# Altium footprint library Control_Board_Model.PcbLib: 160 footprints (part 2 of 10)
Each footprint in its own frame and in the unit in brackets; x right, y up, seen from the top. Pads: shape width x height; smd on the part's side, far side on the other; paste and mask are expansions set on the pad; w line width, h text height; cw(c..) or ccw(c..) is an arc to the next point about the centre after c.
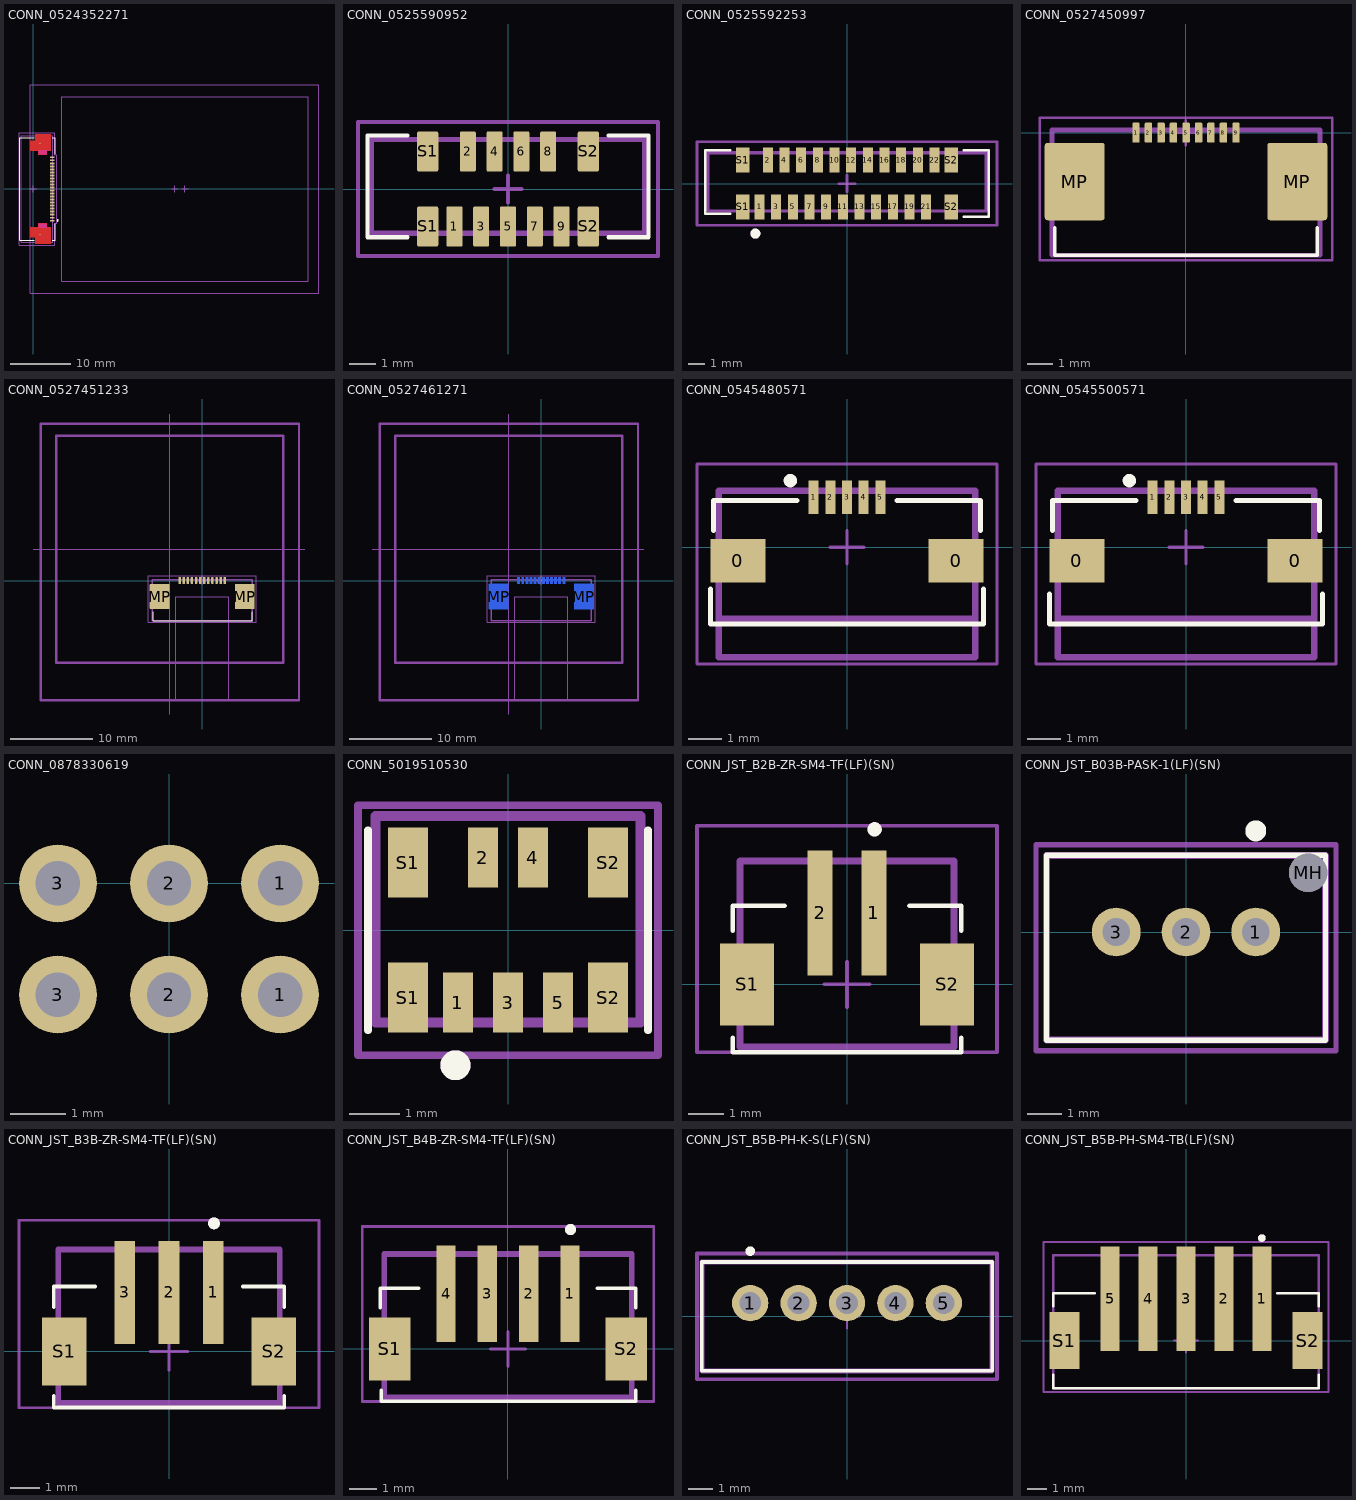
[diagram p1: the footprints below, top view; thin cyan lines are the x and y axes]

## CONN_0524352271 [mm] "TFT LCD MODULE"
height 7
pads (24):
  rect 0.8x0.3 smd mask+0.05: 1(3.1,-5.25) 2(3.1,-4.75) 3(3.1,-4.25) 4(3.1,-3.75) 5(3.1,-3.25) 6(3.1,-2.75) 7(3.1,-2.25) 8(3.1,-1.75) 9(3.1,-1.25) 10(3.1,-0.75) 11(3.1,-0.25) 12(3.1,0.25) 13(3.1,0.75) 14(3.1,1.25) 15(3.1,1.75) 16(3.1,2.25) 17(3.1,2.75) 18(3.1,3.25) 19(3.1,3.75) 20(3.1,4.25) 21(3.1,4.75) 22(3.1,5.25)
  rect 0.2x0.2 smd mask+0.05: 23(1.1,7.55) 24(1.1,-7.55)
Top Layer:
  pour cut-out: -0.55,-6.3 -0.55,-8 0.3,-8 0.3,-9.1 2.9,-9.1 2.9,-6.3 2.2,-6.3 2.2,-5.7 0.8,-5.7 0.8,-6.3
  pour cut-out: -0.55,6.3 -0.55,8 0.3,8 0.3,9.1 2.9,9.1 2.9,6.3 2.2,6.3 2.2,5.7 0.8,5.7 0.8,6.3
  region: 2.7,-6.5 2.7,-8.9 0.5,-8.9 0.5,-7.8 -0.35,-7.8 -0.35,-6.5
  region: 2.7,6.5 2.7,8.9 0.5,8.9 0.5,7.8 -0.35,7.8 -0.35,6.5
Top Layer keep-out:
  rectangle: 0.8,-6.5 2.2,-5.7
  rectangle: 0.8,5.7 2.2,6.5
Top Overlay:
  circle w0.2: c4.005,-5.207 r0.1
  lines w0.152: 0.1,-8.5 -2.3,-8.5 -2.3,8.5 0.1,8.5 ; 3.1,-8.5 3.6,-8.5 3.6,-5.761 ; 3.1,8.5 3.6,8.5 3.6,5.761
Top Paste:
  region: 2.7,6.5 2.7,8.9 0.5,8.9 0.5,7.8 -0.35,7.8 -0.35,6.5
  region: 2.7,-6.5 2.7,-8.9 0.5,-8.9 0.5,-7.8 -0.35,-7.8 -0.35,-6.5
Top Solder:
  region: 2.75,-6.45 2.75,-8.95 0.45,-8.95 0.45,-7.85 -0.4,-7.85 -0.4,-6.45
  region: 2.75,6.45 2.75,8.95 0.45,8.95 0.45,7.85 -0.4,7.85 -0.4,6.45
Mechanical 14:
  lines w0.2: -2,-8.8 3.2,-8.8 3.2,8.8 -2,8.8 -2,-8.8
  text "22" at 1.465,5.969 h1
  text "1" at 1.465,-5.08 h1
  text "'.Designator'" at -0.9,-0.2 h0.5
Mechanical 15:
  lines w0.1: -0.5,0 0.5,0 ; 0,-0.5 0,0.5
  lines w0.152: -2.4,-9.3 0.1,-9.3 3.1,-9.3 3.554,-9.3 3.554,-5.682 3.875,-5.682 3.875,5.682 3.554,5.682 3.554,9.3 -2.4,9.3 -2.4,-9.3
Mechanical 19:
  lines w0.2: 22.9,0 23.9,0 ; 23.4,-0.5 23.4,0.5 ; 24.6,0 25.6,0 ; 25.1,-0.5 25.1,0.5 ; -0.5,-17.3 -0.5,17.3 47.3,17.3 47.3,-17.3 -0.5,-17.3 ; 4.7,-15.3 4.7,15.3 45.5,15.3 45.5,-15.3 4.7,-15.3
  text "Top Left Corner" at 43.9,-14.8 h1
  text "Center of the screen" at 25.7,-8.9 h1
  text "Center of the panel" at 21.7,-9.1 h1
3D body "524352271.stp": height 2.1, standoff 0.05, extent -2,-8.8 3.2,8.8
3D body: height -6, standoff -8, extent -0.5,-17.3 47.3,17.3

## CONN_0525590952 [mm] "9 Position FFC, FPC Connector Contacts, Vertical - 1 Sided 0.020\" (0.50mm) Surface Mount"
height 3.9
pads (13):
  rrect20% 0.6x1.5 smd mask+0.05: 1(-2,-1.4) 2(-1.5,1.4) 3(-1,-1.4) 4(-0.5,1.4) 5(0,-1.4) 6(0.5,1.4) 7(1,-1.4) 8(1.5,1.4) 9(2,-1.4)
  rrect20% 0.8x1.5 smd mask+0.05: S1(-3,-1.4) S1(-3,1.4) S2(3,-1.4) S2(3,1.4)
Top Overlay:
  lines w0.152: -3.75,-1.8 -5.25,-1.8 -5.25,2 -3.75,2 ; 3.75,-1.8 5.25,-1.8 5.25,2 3.75,2
Mechanical 14:
  lines w0.2: -5.1,-1.65 -5.1,1.85 5.1,1.85 5.1,-1.65 -5.1,-1.65
Mechanical 15:
  lines w0.152: -0.5,0 0.5,0 ; 0,-0.5 0,0.5 ; -5.6,-2.5 -5.6,2.5 5.6,2.5 5.6,-2.5 -5.6,-2.5
3D body "525590952.stp": height 3.9, standoff 0, extent -5.1,-1.65 5.1,1.85

## CONN_0525592253 [mm] "22 Position FFC, FPC Connector Contacts, Vertical - 1 Sided 0.020\" (0.50mm) Surface Mount"
height 3.9
pads (26):
  rect 0.6x1.5 smd mask+0.05: 1(-5.25,-1.4) 2(-4.75,1.4) 3(-4.25,-1.4) 4(-3.75,1.4) 5(-3.25,-1.4) 6(-2.75,1.4) 7(-2.25,-1.4) 8(-1.75,1.4) 9(-1.25,-1.4) 10(-0.75,1.4) 11(-0.25,-1.4) 12(0.25,1.4) 13(0.75,-1.4) 14(1.25,1.4) 15(1.75,-1.4) 16(2.25,1.4) 17(2.75,-1.4) 18(3.25,1.4) 19(3.75,-1.4) 20(4.25,1.4) 21(4.75,-1.4) 22(5.25,1.4)
  rect 0.8x1.5 smd mask+0.05: S1(-6.25,-1.4) S1(-6.25,1.4) S2(6.25,-1.4) S2(6.25,1.4)
Top Overlay:
  circle w0.3: c-5.5,-3 r0.15
  lines w0.152: -7,-1.8 -8.5,-1.8 -8.5,2 -7,2 ; 7,-2 8.5,-2 8.5,2 7,2
Mechanical 14:
  circle w0.3: c-5.5,-3 r0.15
  lines w0.2: -8.35,-1.65 -8.35,1.85 8.35,1.85 8.35,-1.65 -8.35,-1.65
  text "'.Designator'" at -1.2,-0.2 h0.5
Mechanical 15:
  lines w0.152: -0.5,0 0.5,0 ; 0,-0.5 0,0.5 ; -9,-2.5 -9,2.5 9,2.5 9,-2.5 -9,-2.5
3D body "525592253.stp": height 3.9, standoff 0, extent -8.35,-1.65 8.35,1.85

## CONN_0527450997 [mm] "9 Position - Connector Contacts, Top 0.020\" (0.50mm) Surface Mount, Right Angle"
height 2
pads (11):
  rrect20% 0.3x0.8 smd: 1(-2,0) 2(-1.5,0) 3(-1,0) 4(-0.5,0) 5(0,0) 6(0.5,0) 7(1,0) 8(1.5,0) 9(2,0)
  rrect10% 2.4x3.1 smd: MP(-4.45,-1.95) MP(4.45,-1.95)
Top Overlay:
  lines w0.152: -5.25,-3.8 -5.25,-4.9 5.25,-4.9 5.25,-3.8
Mechanical 14:
  lines w0.2: -5.35,-4.9 5.35,-4.9 5.35,0.1 -5.35,0.1 -5.35,-4.9
  text "'.Designator'" at -2.75,-2.25 h0.5
  text "1" at -2.05,-1.2 h0.5
  text "9" at 1.825,-1.225 h0.5
Mechanical 15:
  lines w0.1: -0.5,0 0.5,0 ; 0,-0.5 0,0.5 ; -5.85,-5.1 -5.85,0.6 5.85,0.6 5.85,-5.1 -5.85,-5.1
3D body "527450997.stp": height 2, standoff 0, extent -5.3,-4.9 5.3,0.1

## CONN_0527451233 [mm] "12 Position FFC, FPC Connector Contacts, Top 0.020\" (0.50mm) Surface Mount, Right Angle"
height 2
pads (14):
  rrect20% 0.3x0.8 smd: 1(2.75,0) 2(2.25,0) 3(1.75,0) 4(1.25,0) 5(0.75,0) 6(0.25,0) 7(-0.25,0) 8(-0.75,0) 9(-1.25,0) 10(-1.75,0) 11(-2.25,0) 12(-2.75,0)
  rrect10% 2.4x3.1 smd: MP(-5.2,-1.95) MP(5.2,-1.95)
Top Overlay:
  lines w0.152: -6,-3.8 -6,-4.9 6.1,-4.9 6.1,-3.8
Mechanical 14:
  lines w0.1: -20.6,3.8 12.5,3.8 ; -3.95,-16.275 -3.95,20.3 ; -3.25,-14.6 -3.25,-2 3.25,-2 3.25,-14.6 -3.25,-14.6
  lines w0.2: -6.1,-4.9 6.1,-4.9 6.1,0.1 -6.1,0.1 -6.1,-4.9
  lines w0.3: -19.7,-14.6 -19.7,19.1 11.8,19.1 11.8,-14.6 -3.95,-14.6 -19.7,-14.6 ; -17.8,-10.05 -17.8,17.65 9.9,17.65 9.9,-10.05 -17.8,-10.05
  text "'.Designator'" at -2.8,-2 h0.5
  text "1" at 2.7,-1.2 h0.5
  text "12" at -3.1,-1.2 h0.5
Mechanical 15:
  lines w0.1: -0.5,0 0.5,0 ; 0,-0.5 0,0.5 ; -6.6,-5.1 -6.6,0.6 6.6,0.6 6.6,-5.1 -6.6,-5.1
3D body: height 3.5, standoff 2, extent -19.7,-14.6 11.8,19.1
3D body: height 3.6, standoff 2, extent -17.8,-10.05 9.9,17.65
3D body "527451233.stp": height 2, standoff 0, extent -6.05,-4.9 6.05,0.1

## CONN_0527461271 [mm] "12 Position FFC, FPC Connector Contacts, Bottom 0.020\" (0.50mm) Surface Mount, Right Angle"
height 1.5
pads (14):
  rrect20% 0.3x0.8 smd far side: 1(2.75,0) 2(2.25,0) 3(1.75,0) 4(1.25,0) 5(0.75,0) 6(0.25,0) 7(-0.25,0) 8(-0.75,0) 9(-1.25,0) 10(-1.75,0) 11(-2.25,0) 12(-2.75,0)
  rrect10% 2.4x3.1 smd far side: MP(-5.2,-1.95) MP(5.2,-1.95)
Bottom Overlay:
  lines w0.152: -6.1,-3.8 -6.1,-4.9 6,-4.9 6,-3.8
Mechanical 14:
  lines w0.1: -20.6,3.8 12.5,3.8 ; -3.95,-16.275 -3.95,20.3 ; -3.25,-14.6 -3.25,-2 3.25,-2 3.25,-14.6 -3.25,-14.6
  lines w0.2: -6.1,-4.9 -6.1,0.1 6.1,0.1 6.1,-4.9 -6.1,-4.9
  lines w0.3: -19.7,-14.6 -19.7,19.1 11.8,19.1 11.8,-14.6 -3.95,-14.6 -19.7,-14.6 ; -17.8,-10.05 -17.8,17.65 9.9,17.65 9.9,-10.05 -17.8,-10.05
  text "'.Designator'" at 2.8,-2 h0.5
  text "1" at 2.8,-1.2 h0.5
  text "12" at -2.4,-1.2 h0.5
Mechanical 15:
  lines w0.1: -0.5,0 0.5,0 ; 0,-0.5 0,0.5 ; -6.6,-5.1 6.6,-5.1 6.6,0.6 -6.6,0.6 -6.6,-5.1
3D body: height 3.5, standoff 2, extent -19.7,-14.6 11.8,19.1
3D body: height 3.6, standoff 2, extent -17.8,-10.05 9.9,17.65
3D body "527461271.stp": height 2, standoff -0.02, extent -6.05,-4.9 6.05,0.1

## CONN_0545480571 [mm] "5 Position FFC, FPC Connector Contacts, Bottom 0.020\" (0.50mm) Surface Mount, Right Angle"
height 1.2
pads (7):
  rect 1.65x1.3 smd mask+0.05: 0(-3.275,-0.4) 0(3.275,-0.4)
  rect 0.3x1 smd mask+0.05: 1(-1,1.5) 2(-0.5,1.5) 3(0,1.5) 4(0.5,1.5) 5(1,1.5)
Top Overlay:
  circle w0.2: c-1.7,2 r0.1
  lines w0.152: -4.1,-1.25 -4.1,-2.3 4.1,-2.3 4.1,-1.25 ; -4,0.5 -4,1.4 -1.5,1.4 ; 1.5,1.4 4,1.4 4,0.5
Mechanical 14:
  lines w0.2: -3.85,-2.15 3.85,-2.15 ; -3.85,-3.3 3.85,-3.3 3.85,1.7 -3.85,1.7 -3.85,-3.3
  text "'.Designator'" at -1,-1.5 h0.5
  text "1" at -1.1,0.3 h0.5
  text "5" at 0.9,0.3 h0.5
Mechanical 15:
  lines w0.1: -0.5,0 0.5,0 ; 0,-0.5 0,0.5 ; -4.5,-3.5 -4.5,2.5 4.5,2.5 4.5,-3.5 -4.5,-3.5
3D body "545480571.stp": height 1.18, standoff -0.02, extent -3.85,-3.3 3.85,1.7

## CONN_0545500571 [mm] "5 Position FFC, FPC Connector Contacts, Top 0.020\" (0.50mm) Surface Mount, Right Angle"
height 1.2
pads (7):
  rect 1.65x1.3 smd mask+0.05: 0(-3.275,-0.4) 0(3.275,-0.4)
  rect 0.3x1 smd mask+0.05: 1(-1,1.5) 2(-0.5,1.5) 3(0,1.5) 4(0.5,1.5) 5(1,1.5)
Top Overlay:
  circle w0.2: c-1.7,2 r0.1
  lines w0.152: -4.1,-1.4 -4.1,-2.3 4.1,-2.3 4.1,-1.4 ; -4,0.5 -4,1.4 -1.5,1.4 ; 1.5,1.4 4,1.4 4,0.5
Mechanical 14:
  lines w0.2: -3.85,-2.15 3.85,-2.15 ; -3.85,-3.3 -3.85,1.7 3.85,1.7 3.85,-3.3 -3.85,-3.3
  text "5" at 0.9,0.3 h0.5
  text "1" at -1.1,0.3 h0.5
  text "'.Designator'" at -1,-1.5 h0.5
Mechanical 15:
  lines w0.1: -0.5,0 0.5,0 ; 0,-0.5 0,0.5 ; -4.5,-3.5 4.5,-3.5 4.5,2.5 -4.5,2.5 -4.5,-3.5
3D body "545500571.stp": height 1.2, standoff 0, extent -3.85,-3.3 3.85,1.7

## CONN_0878330619 [mm] "Connector Header Through Hole, Right Angle 6 position 0.079\" (2.00mm)"
height 6.3
pads (6):
  round 1.4 hole 0.8: 1(2,-2) 1(2,0) 2(0,-2) 2(0,0) 3(-2,-2) 3(-2,0)
Mechanical 15:
  lines w0.1: -0.5,0 0.5,0 ; 0,-0.5 0,0.5
3D body "878330619.stp": height 6.35, standoff -2.11, extent -4.325,-8.4 4.325,0.25

## CONN_5019510530 [mm] "5 Position FFC, FPC Connector Contacts, Vertical - 1 Sided 0.020\" (0.50mm) Surface Mount"
height 4.04
pads (9):
  rect 0.6x1.2 smd mask+0.05: 1(-1,-1.45) 2(-0.5,1.45) 3(0,-1.45) 4(0.5,1.45) 5(1,-1.45)
  rect 0.8x1.4 smd mask+0.05: S1(-2,-1.35) S1(-2,1.35) S2(2,-1.35) S2(2,1.35)
Top Overlay:
  circle w0.3: c-1.05,-2.7 r0.15
  lines w0.152: -2.8,-2 -2.8,2 ; 2.8,-2 2.8,2
Mechanical 14:
  circle w0.3: c-1.05,-2.7 r0.15
  lines w0.2: -2.65,-1.85 -2.65,2.284 2.65,2.284 2.65,-1.85 -2.65,-1.85
  text "'.Designator'" at -1.3,-0.2 h0.5
Mechanical 15:
  lines w0.152: -3,-2.5 -3,2.5 3,2.5 3,-2.5 -3,-2.5
3D body "5019510530.stp": height 4.34, standoff 0, extent -2.65,-1.85 2.65,2.284

## CONN_JST_B2B-ZR-SM4-TF(LF)(SN) [mm] "Connector Header Surface Mount 2 position 0.059\" (1.50mm)"
height 5
pads (4):
  rect 0.7x3.5 smd: 1(0.75,2) 2(-0.75,2)
  rect 1.5x2.3 smd: S1(-2.8,0) S2(2.8,0)
Top Overlay:
  circle w0.2: c0.774,4.34 r0.1
  lines w0.127: -3.2,-1.5 -3.2,-1.9 3.2,-1.9 3.2,-1.5 ; -3.2,1.5 -3.2,2.2 -1.75,2.2 ; 1.75,2.2 3.2,2.2 3.2,1.5
Mechanical 14:
  circle w0.2: c0.774,4.34 r0.1
  lines w0.2: -3,-1.75 3,-1.75 3,3.45 -3,3.45 -3,-1.75
  text "'.Designator'" at -1.766,-0.254 h0.5
Mechanical 15:
  lines w0.1: -0.635,0 0.635,0 ; 0,-0.635 0,0.635 ; -4.2,-1.905 -4.2,4.445 4.2,4.445 4.2,-1.905 -4.2,-1.905
3D body "B2B-ZR-SM4-TF.STEP": height 5, standoff 0, extent -3,-1.75 3,3.45

## CONN_JST_B03B-PASK-1(LF)(SN) [mm] "Connector Header Through Hole 3 position 0.079\" (2.00mm)"
height 7.7
pads (4):
  round 1.4 hole 0.8: 1(2,0) 2(0,0) 3(-2,0)
  round 1.1 hole 1.1 unplated: MH(3.5,1.7)
Top Overlay:
  circle w0.4: c2,2.9 r0.1
  lines w0.152: -4,-3.1 -4,2.2 4,2.2 4,-3.1 -4,-3.1
Mechanical 14:
  lines w0.2: -4,-3.1 -4,2.2 4,2.2 4,-3.1 -4,-3.1
  text "1" at 1.9,-0.4 h1.02
  text "2" at -0.3,-0.4 h1.02
  text "3" at -2.2,-0.5 h1.02
  text "'.Designator'" at -2.5,-1 h0.5
Mechanical 15:
  lines w0.1: -0.5,0 0.5,0 ; 0,-0.5 0,0.5
  lines w0.152: -4.3,-3.4 4.3,-3.4 4.3,2.5 -4.3,2.5 -4.3,-3.4
3D body "B03B-PASK-1 (2).STEP": height 7.7, standoff -2.7, extent -4,-3.1 4,2.2

## CONN_JST_B3B-ZR-SM4-TF(LF)(SN) [mm] "Connector Header Surface Mount 3 position 0.059\" (1.50mm)"
height 5
pads (5):
  rect 0.7x3.5 smd: 1(1.5,2) 2(0,2) 3(-1.5,2)
  rect 1.5x2.3 smd: S1(-3.55,0) S2(3.55,0)
Top Overlay:
  circle w0.2: c1.524,4.34 r0.1
  lines w0.127: -3.9,-1.5 -3.9,-1.9 3.9,-1.9 3.9,-1.5 ; -3.9,1.5 -3.9,2.2 -2.5,2.2 ; 2.5,2.2 3.9,2.2 3.9,1.5
Mechanical 14:
  circle w0.2: c1.524,4.34 r0.1
  lines w0.2: -3.75,-1.75 3.75,-1.75 3.75,3.45 -3.75,3.45 -3.75,-1.75
  text "'.Designator'" at -1.016,-0.254 h0.5
Mechanical 15:
  lines w0.1: -0.635,0 0.635,0 ; 0,-0.635 0,0.635 ; -5.08,-1.905 -5.08,4.445 5.08,4.445 5.08,-1.905 -5.08,-1.905
3D body "B3B-ZR-SM4-TF.STEP": height 5, standoff 0, extent -3.75,-1.75 3.75,3.45

## CONN_JST_B4B-ZR-SM4-TF(LF)(SN) [mm] "Connector Header Surface Mount 4 position 0.059\" (1.50mm)"
height 5
pads (6):
  rect 0.7x3.5 smd: 1(2.25,2) 2(0.75,2) 3(-0.75,2) 4(-2.25,2)
  rect 1.5x2.3 smd: S1(-4.3,0) S2(4.3,0)
Top Overlay:
  circle w0.2: c2.274,4.34 r0.1
  lines w0.127: -4.65,1.5 -4.65,2.2 -3.25,2.2 ; -4.6,-1.5 -4.6,-1.9 4.65,-1.9 4.65,-1.5 ; 3.25,2.2 4.65,2.2 4.65,1.5
Mechanical 14:
  circle w0.2: c2.274,4.34 r0.1
  lines w0.2: -4.5,-1.75 -4.5,3.45 4.5,3.45 4.5,-1.75 -4.5,-1.75
  text "'.Designator'" at -1.125,-0.325 h0.5
Mechanical 15:
  lines w0.1: -0.635,0 0.635,0 ; 0,-0.635 0,0.635 ; -5.3,-1.905 5.3,-1.905 5.3,4.445 -5.3,4.445 -5.3,-1.905
3D body "B4B-ZR-SM4-TF.STEP": height 5, standoff 0, extent -4.5,-1.75 4.5,3.45

## CONN_JST_B5B-PH-K-S(LF)(SN) [mm] "CONN HEADER R/A 5POS 2MM"
height 3.7
pads (5):
  round 1.5 hole 0.9: 1(-4,0.55) 2(-2,0.55) 3(0,0.55) 4(2,0.55) 5(4,0.55)
Top Overlay:
  circle w0.2: c-4,2.7 r0.1
  lines w0.152: -6,-2.25 6,-2.25 6,2.25 -6,2.25 -6,-2.25
Mechanical 14:
  lines w0.2: -6,-2.25 6,-2.25 6,2.25 -6,2.25 -6,-2.25
  text "'.Designator'" at -2.8,-0.9 h0.5
Mechanical 15:
  lines w0.1: -0.5,0 0.5,0 ; 0,-0.5 0,0.5
  lines w0.152: -6.2,-2.6 -6.2,2.6 6.2,2.6 6.2,-2.6 -6.2,-2.6
3D body "User Library-B5B-PH-K-S(LF)(SN).step": height 6, standoff -3.4, extent -5.95,-2.25 5.95,2.25

## CONN_JST_B5B-PH-SM4-TB(LF)(SN) [mm]
pads (7):
  rect 1x5.5 smd: 1(4,2.2) 2(2,2.2) 3(0,2.2) 4(-2,2.2) 5(-4,2.2)
  rect 1.6x3 smd: S1(-6.4,0) S2(6.4,0)
Top Overlay:
  circle w0.2: c4,5.4 r0.1
  lines w0.127: -7,-1.8 -7,-2.5 7,-2.5 7,-1.8 ; -7,1.8 -7,2.5 -4.8,2.5 ; 4.8,2.5 7,2.5 7,1.8
Mechanical 14:
  circle w0.2: c4,5.4 r0.1
  lines w0.127: -7,-2.5 7,-2.5 7,4.5 -7,4.5 -7,-2.5
  text "'.Designator'" at -1.6,-0.2 h0.5
Mechanical 15:
  lines w0.1: -0.635,0 0.635,0 ; 0,-0.635 0,0.635 ; -7.5,-2.7 -7.5,5.2 7.5,5.2 7.5,-2.7 -7.5,-2.7